# Altium footprint library Traffic_Lignt_CU20170805-1635.PcbLib: 44 footprints (part 1 of 3)
Each footprint in its own frame and in the unit in brackets; x right, y up, seen from the top. Pads: shape width x height; smd on the part's side, far side on the other; paste and mask are expansions set on the pad; w line width, h text height; cw(c..) or ccw(c..) is an arc to the next point about the centre after c.
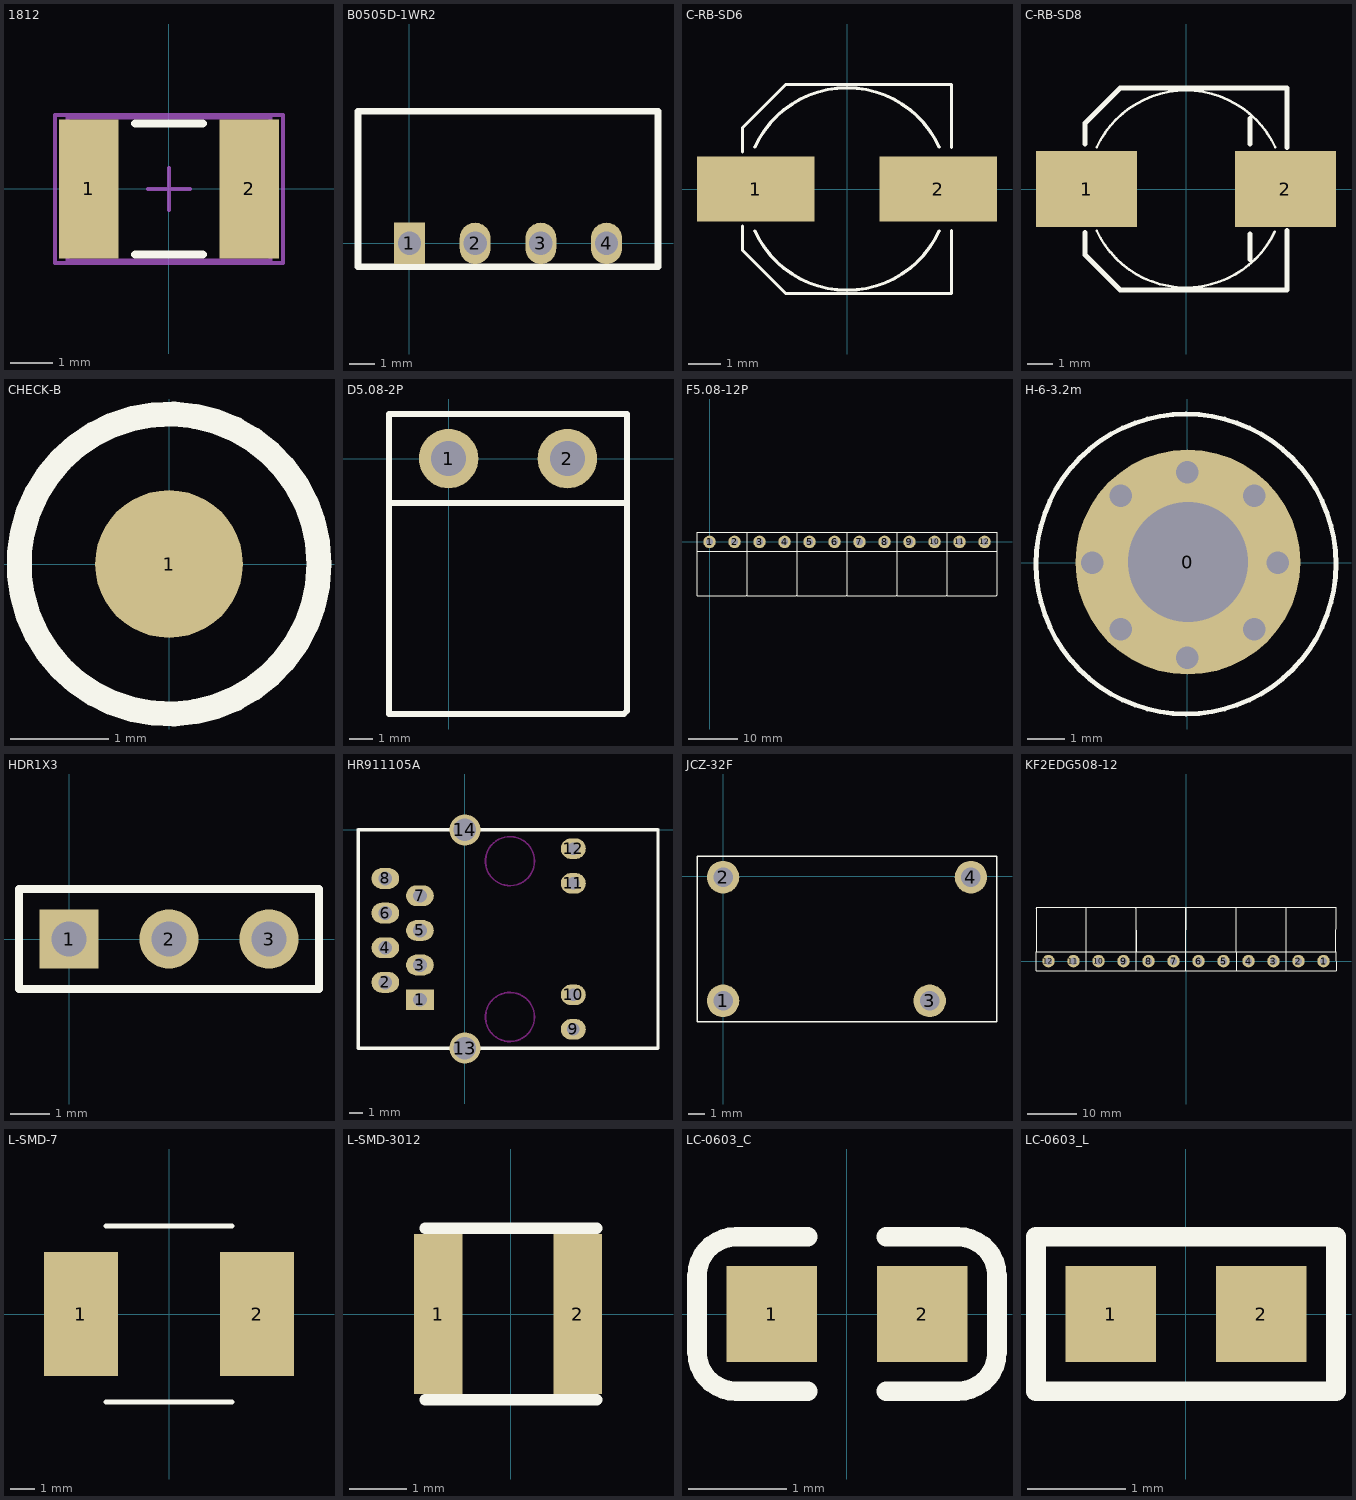
[diagram p0: the footprints below, top view; thin cyan lines are the x and y axes]

## 1812 [mm] "Chip Capacitor, Body 4.5x3.2mm, I"
height 1.4
pads (2):
  rect 1.4x3.3 smd: 1(-1.9,0) 2(1.9,0)
Top Overlay:
  lines w0.2: -0.8,-1.55 0.8,-1.55 ; -0.8,1.55 0.8,1.55
Mechanical 13:
  lines w0.1: -2.4,-1.7 -2.4,1.7 2.4,1.7 2.4,-1.7 -2.4,-1.7
Mechanical 15:
  lines w0.1: -0.5,0 0.5,0 ; 0,-0.5 0,0.5 ; -2.7,-1.75 -2.7,1.75 2.7,1.75 2.7,-1.75 -2.7,-1.75
3D body: height 1.4, standoff 0, extent -2.4,-1.7 2.4,1.7

## B0505D-1WR2 [mm]
height 1.5
pads (4):
  rect 1.2x1.6 hole 0.9: 1(0,0)
  oval 1.2x1.6 hole 0.9: 2(2.54,0) 3(5.08,0) 4(7.62,0)
Top Overlay:
  lines w0.254: -1.99,5.08 -1.99,-0.9 9.61,-0.9 9.61,5.1 -1.99,5.1

## C-RB-SD6 [mm] "贴片"
height 7
pads (2):
  rect 3.6x2 smd: 1(-2.794,0) 2(2.794,0)
Top Overlay:
  lines w0.1: -3.2,-1.143 -3.2,-1.88 -1.88,-3.2 3.2,-3.2 3.2,-1.27 ; -3.2,1.143 -3.2,1.88 -1.88,3.2 3.2,3.2 3.2,1.27 ; -2.822,-1.283 ccw(c0,0) 2.822,-1.283 ; -2.822,1.283 cw(c0,0) 2.822,1.283

## C-RB-SD8 [mm] "贴片"
height 10.2
pads (2):
  rect 4x3 smd: 1(-3.937,0) 2(3.937,0)
Top Overlay:
  lines w0.1: -3.539,-1.643 ccw(c0,0) 3.516,-1.693 ; -3.539,1.643 cw(c0,0) 3.539,1.643
  lines w0.2: -4,-1.714 -4,-2.604 -2.604,-4 4,-4 4,-1.651 ; -4,1.778 -4,2.604 -2.604,4 4,4 4,1.651 ; 2.54,-2.794 2.54,-1.778 ; 2.54,1.778 2.54,2.794
3D body: height 8, standoff 0, extent -3.953,-3.992 4.015,3.992
3D body: height 0.6, standoff 0, extent -3.937,-3.937 3.937,3.937

## CHECK-B [mm]
height 1.45
pads (1):
  round 1.5 smd: 1(0,0)
Top Overlay:
  circle w0.254: c0,0 r1.524

## D5.08-2P [mm]
pads (2):
  round 2.54 hole 1.5: 1(0,0) 2(5.08,0)
Top Overlay:
  lines w0.254: -2.54,-1.905 7.62,-1.905 ; -2.54,-1.905 -2.54,1.905 7.62,1.905 7.62,-1.905 ; -2.54,-1.905 -2.54,-10.922 5.08,-10.922 7.493,-10.922 7.62,-10.795 7.62,-1.905

## F5.08-12P [mm]
pads (12):
  round 2.54 hole 1.5: 1(0,0) 2(5.08,0) 3(10.16,0) 4(15.24,0) 5(20.32,0) 6(25.4,0) 7(30.48,0) 8(35.56,0) 9(40.64,0) 10(45.72,0) 11(50.8,0) 12(55.88,0)
Top Overlay:
  lines w0.254: -2.54,-1.905 7.62,-1.905 ; -2.54,-1.905 -2.54,1.905 7.62,1.905 ; -2.54,-1.905 -2.54,-10.922 5.08,-10.922 7.493,-10.922 7.62,-10.795 7.62,-1.905 ; 7.62,-1.905 17.78,-1.905 ; 7.62,-1.905 7.62,1.905 ; 7.62,-1.905 7.62,-10.922 15.24,-10.922 17.653,-10.922 17.78,-10.795 17.78,-1.905 ; 7.62,-1.905 7.62,1.905 ; 7.62,1.905 17.78,1.905 ; 17.78,-1.905 17.78,1.905 ; 17.78,-1.905 27.94,-1.905 ; 17.78,-1.905 17.78,1.905 ; 17.78,-1.905 17.78,-10.922 25.4,-10.922 27.813,-10.922 27.94,-10.795 27.94,-1.905 ; 17.78,1.905 27.94,1.905 ; 27.94,-1.905 38.1,-1.905 ; 27.94,-1.905 27.94,1.905 ; 27.94,-1.905 27.94,-10.922 35.56,-10.922 37.973,-10.922 38.1,-10.795 38.1,-1.905 ; 27.94,-1.905 27.94,1.905 ; 27.94,1.905 38.1,1.905 ; 38.1,-1.905 38.1,1.905 ; 38.1,-1.905 48.26,-1.905 ; 38.1,-1.905 38.1,1.905 ; 38.1,-1.905 38.1,-10.922 45.72,-10.922 48.133,-10.922 48.26,-10.795 48.26,-1.905 ; 38.1,1.905 48.26,1.905 ; 48.26,-1.905 58.42,-1.905 ; 48.26,-1.905 48.26,1.905 ; 48.26,-1.905 48.26,-10.922 55.88,-10.922 58.293,-10.922 58.42,-10.795 58.42,-1.905 ; 48.26,-1.905 48.26,1.905 ; 48.26,1.905 58.42,1.905 58.42,-1.905

## H-6-3.2m [mm]
pads (1):
  round 6 hole 3.2: 0(0.009,0.009)
via -1.778,1.778 diameter 0.8 hole 0.6
via -2.54,0 diameter 0.8 hole 0.6
via -1.778,-1.778 diameter 0.8 hole 0.6
via 0,-2.54 diameter 0.8 hole 0.6
via 1.778,-1.778 diameter 0.8 hole 0.6
via 2.413,0 diameter 0.8 hole 0.6
via 1.778,1.778 diameter 0.8 hole 0.6
via 0,2.413 diameter 0.8 hole 0.6
Top Overlay:
  circle w0.127: c-0.04,-0.04 r4

## HDR1X3 [mm] "Connector; Heade"
pads (3):
  rect 1.5x1.5 hole 0.9: 1(0,0)
  round 1.5 hole 0.9: 2(2.54,0) 3(5.08,0)
Top Overlay:
  lines w0.2: -1.27,-1.27 -1.27,1.27 6.35,1.27 6.35,-1.27 -1.27,-1.27

## HR911105A [mil]
pads (14):
  rect 80x60 hole 40: 1(-130,-490)
  oval 80x60 hole 40: 2(-230,-440) 3(-130,-390) 4(-230,-340) 5(-130,-290) 6(-230,-240) 7(-130,-190) 8(-230,-140)
  oval 72x60 hole 36: 9(312.91,-575.63) 10(312.91,-476) 11(312.91,-154.13) 12(312.91,-54)
  round 90 hole 65: 13(-0.08,-629.76) 14(-0.08,0.16)
Top Overlay:
  lines w10: -308.74,-630 -308.5,-629.76 ; -308.74,0 -308.58,0.16 ; -308.58,0.16 -308.58,-629.69 -308.5,-629.76 ; -308.58,0.16 -0.08,0.16 557.24,0.16 557.4,0 557.4,-630 557.17,-629.76 -0.08,-629.76 -308.5,-629.76
Keep-Out Layer:
  circle w5: c130,-540 r70.8
  circle w5: c130,-90 r70.8

## JCZ-32F [mm]
pads (4):
  round 2 hole 1.2: 1(0,-7.645) 2(0,-0.045) 3(12.7,-7.645) 4(15.24,-0.045)
Top Overlay:
  lines w0.091: -1.6,-8.945 -1.6,-7.645 -1.6,1.255 0,1.255 16.83,1.255 ; -1.595,-8.945 0,-8.945 16.836,-8.945 ; 16.84,-8.941 16.84,-7.645 16.84,1.255

## KF2EDG508-12 [mm]
pads (12):
  round 2.54 hole 1.5: 1(27.94,0) 2(22.86,0) 3(17.78,0) 4(12.7,0) 5(7.62,0) 6(2.54,0) 7(-2.54,0) 8(-7.62,0) 9(-12.7,0) 10(-17.78,0) 11(-22.86,0) 12(-27.94,0)
Top Overlay:
  lines w0.254: -30.48,1.905 -30.48,10.795 -30.353,10.922 -27.94,10.922 -20.32,10.922 -20.32,1.905 ; -30.48,1.905 -20.32,1.905 ; -30.48,1.905 -30.48,-1.905 -20.32,-1.905 ; -20.32,-1.905 -20.32,1.905 ; -20.32,-1.905 -10.16,-1.905 ; -20.32,-1.905 -20.32,1.905 ; -20.32,1.905 -20.32,10.795 -20.193,10.922 -17.78,10.922 -10.16,10.922 -10.16,1.905 ; -20.32,1.905 -10.16,1.905 ; -10.16,-1.905 -10.16,1.905 ; -10.16,-1.905 -10.16,1.905 ; -10.16,-1.905 0,-1.905 ; -10.16,1.905 -10.16,10.795 -10.033,10.922 -7.62,10.922 0,10.922 0,1.905 ; -10.16,1.905 0,1.905 ; 0,-1.905 0,1.905 ; 0,-1.905 10.16,-1.905 ; 0,-1.905 0,1.905 ; 0,1.905 0,10.795 0.127,10.922 2.54,10.922 10.16,10.922 10.16,1.905 ; 0,1.905 10.16,1.905 ; 10.16,-1.905 10.16,1.905 ; 10.16,-1.905 10.16,1.905 ; 10.16,-1.905 20.32,-1.905 ; 10.16,1.905 10.16,10.795 10.287,10.922 12.7,10.922 20.32,10.922 20.32,1.905 ; 10.16,1.905 20.32,1.905 ; 20.32,-1.905 20.32,1.905 ; 20.32,-1.905 30.48,-1.905 30.48,1.905 ; 20.32,-1.905 20.32,1.905 ; 20.32,1.905 20.32,10.795 20.447,10.922 22.86,10.922 30.48,10.922 30.48,1.905 ; 20.32,1.905 30.48,1.905

## L-SMD-7 [mm]
pads (2):
  rect 3x5 smd: 1(-3.556,0) 2(3.556,0)
Top Overlay:
  lines w0.2: -2.54,-3.556 2.54,-3.556 ; -2.54,3.556 2.54,3.556
3D body: height 4, standoff 0, extent -3.556,-3.556 3.556,3.556

## L-SMD-3012 [mm]
pads (2):
  rect 0.85x2.8 smd: 1(-1.27,0) 2(1.168,0)
Top Overlay:
  lines w0.2: -1.5,-1.5 1.5,-1.5 ; -1.5,1.5 1.5,1.5
3D body: height 4, standoff 0, extent -1.803,-1.6 1.702,1.6

## LC-0603_C [mm]
pads (2):
  rect 0.93x0.98 smd: 1(-0.77,0) 2(0.77,0)
Top Overlay:
  lines w0.2: -0.4,-0.79 -1.135,-0.79 cw(c-1.135,-0.39) -1.535,-0.39 -1.535,0.39 cw(c-1.135,0.39) -1.135,0.79 -0.4,0.79 ; 0.4,-0.79 1.135,-0.79 ccw(c1.135,-0.39) 1.535,-0.39 1.535,0.39 ccw(c1.135,0.39) 1.135,0.79 0.4,0.79
3D body "User Library-0603 SMD Capacitor.STEP": height 0.3, standoff 0, extent -0.8,-0.4 0.8,0.4

## LC-0603_L [mm]
pads (2):
  rect 0.93x0.98 smd: 1(-0.77,0) 2(0.77,0)
Top Overlay:
  lines w0.2: -1.535,-0.79 -1.535,0.79 1.535,0.79 1.535,-0.79 -1.535,-0.79
3D body "L0603.STEP": height 0.46, standoff -0.01, extent -0.825,-0.412 0.825,0.413